# Altium footprint library 全库.PcbLib: 967 footprints (part 61 of 61)
Each footprint in its own frame and in the unit in brackets; x right, y up, seen from the top. Pads: shape width x height; smd on the part's side, far side on the other; paste and mask are expansions set on the pad; w line width, h text height; cw(c..) or ccw(c..) is an arc to the next point about the centre after c.
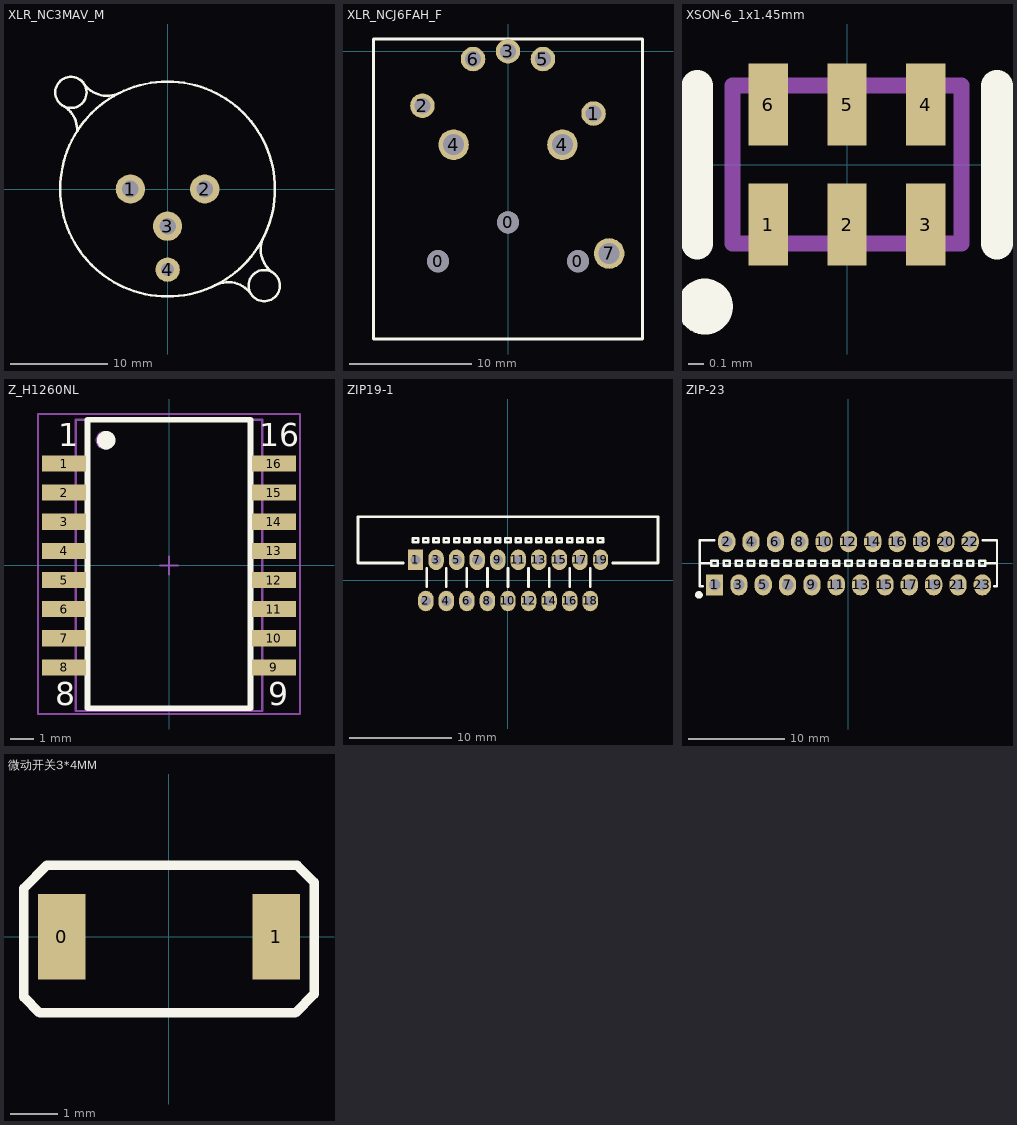
[diagram p60: the footprints below, top view; thin cyan lines are the x and y axes]

## XLR_NC3MAV_M [mm]
pads (4):
  round 3 hole 1.7: 1(-3.81,0) 2(3.81,0) 3(0,-3.81)
  round 2.5 hole 1.3: 4(0,-8.25)
Top Overlay:
  circle w0.254: c9.9,-9.9 r1.6
  circle w0.254: c-9.9,9.9 r1.6
  circle w0.254: c0,0 r11
  lines w0.254: -10.823,8.605 cw(c-12.162,6.021) -9.254,5.918 ; -8.661,10.922 ccw(c-6.19,12.459) -4.851,9.876 ; 4.846,-9.869 cw(c6.186,-12.453) 8.56,-10.77 ; 9.881,-4.826 ccw(c12.454,-6.185) 10.924,-8.661

## XLR_NCJ6FAH_F [mm]
pads (11):
  round 1.8 hole 1.8: 0(-5.715,-17.145) 0(0,-13.97) 0(5.715,-17.145)
  round 2 hole 1.3: 1(6.985,-5.08) 2(-6.985,-4.445) 3(0,0) 5(2.857,-0.635) 6(-2.857,-0.635)
  round 2.5 hole 1.7: 4(-4.445,-7.62) 4(4.445,-7.62) 7(8.255,-16.51)
Top Overlay:
  lines w0.254: -11,-23.495 11,-23.495 11,1.005 -11,1.005 -11,-23.495

## XSON-6_1x1.45mm [mm]
pads (6):
  rect 0.25x0.52 smd mask+0.051: 1(-0.5,-0.38) 2(0,-0.38) 3(0.5,-0.38) 4(0.5,0.38) 5(0,0.38) 6(-0.5,0.38)
Top Overlay:
  circle w0.254: c-0.9,-0.9 r0.05
  lines w0.2: -0.95,-0.5 -0.95,0.5 ; 0.95,-0.5 0.95,0.5
Mechanical 13:
  lines w0.1: -0.725,-0.5 0.725,-0.5 0.725,0.5 -0.725,0.5 -0.725,-0.5

## Z_H1260NL [mm]
pads (16):
  rect 1.91x0.7 smd: 1(-4.573,4.445) 2(-4.573,3.175) 3(-4.573,1.905) 4(-4.573,0.635) 5(-4.573,-0.635) 6(-4.573,-1.905) 7(-4.573,-3.175) 8(-4.573,-4.445) 9(4.573,-4.445) 10(4.573,-3.175) 11(4.573,-1.905) 12(4.573,-0.635) 13(4.573,0.635) 14(4.573,1.905) 15(4.573,3.175) 16(4.573,4.445)
Top Overlay:
  circle w0.4: c-2.741,5.461 r0.2
  lines w0.254: -3.557,-6.223 -3.557,4.445 -3.557,6.35 3.555,6.35 3.555,-6.223 -3.557,-6.223
  text "1" at -4.827,5.207 h1
  text "16" at 3.936,5.207 h1
  text "9" at 4.317,-6.096 h1
  text "8" at -4.954,-6.096 h1
Mechanical 13:
  circle w0.1: c-2.795,5.461 r0.359
  lines w0.1: -4.065,-6.35 4.063,-6.35 4.063,6.35 -4.065,6.35 -4.065,-6.35
Mechanical 15:
  lines w0.1: -0.382,0 0.38,0 ; -0.001,-0.381 -0.001,0.381 ; -5.716,-6.477 5.714,-6.477 5.714,6.604 -4.065,6.604 -5.716,6.604 -5.716,-6.477
3D body: height 0, standoff 0, extent -4.065,-6.35 4.063,6.35

## ZIP19-1 [mm]
pads (19):
  rect 1.5x2 hole 1: 1(-9,2)
  oval 1.5x2 hole 1: 2(-8,-2) 3(-7,2) 4(-6,-2) 5(-5,2) 6(-4,-2) 7(-3,2) 8(-2,-2) 9(-1,2) 10(0,-2) 11(1,2) 12(2,-2) 13(3,2) 14(4,-2) 15(5,2) 16(6,-2) 17(7,2) 18(8,-2) 19(9,2)
Top Overlay:
  lines w0.254: -10.2,1.7 -14.6,1.7 -14.6,6.2 14.6,6.2 14.6,1.7 10.2,1.7 ; -7.9,-0.6 -7.9,1.2 ; -6,-0.6 -6,1.2 ; -4,-0.6 -4,1.2 ; -2,-0.6 -2,1.2 ; 0,-0.6 0,1.2 ; 2,-0.6 2,1.2 ; 4,-0.6 4,1.2 ; 6,-0.6 6,1.2 ; 8,-0.6 8,1.2 ; -9.25,3.7 -9.25,4.1 -8.75,4.1 -8.75,3.7 -9.25,3.7 ; -8.25,3.7 -7.75,3.7 -7.75,4.1 -8.25,4.1 -8.25,3.7 ; -7.25,3.7 -7.25,4.1 -6.75,4.1 -6.75,3.7 -7.25,3.7 ; -6.25,3.7 -5.75,3.7 -5.75,4.1 -6.25,4.1 -6.25,3.7 ; -5.25,3.7 -5.25,4.1 -4.75,4.1 -4.75,3.7 -5.25,3.7 ; -4.25,3.7 -3.75,3.7 -3.75,4.1 -4.25,4.1 -4.25,3.7 ; -3.25,3.7 -3.25,4.1 -2.75,4.1 -2.75,3.7 -3.25,3.7 ; -2.25,3.7 -1.75,3.7 -1.75,4.1 -2.25,4.1 -2.25,3.7 ; -1.25,3.7 -0.75,3.7 -0.75,4.1 -1.25,4.1 -1.25,3.7 ; -0.25,3.7 -0.25,4.1 0.25,4.1 0.25,3.7 -0.25,3.7 ; 0.75,3.7 0.75,4.1 1.25,4.1 1.25,3.7 0.75,3.7 ; 1.75,3.7 2.25,3.7 2.25,4.1 1.75,4.1 1.75,3.7 ; 2.75,3.7 2.75,4.1 3.25,4.1 3.25,3.7 2.75,3.7 ; 3.75,3.7 4.25,3.7 4.25,4.1 3.75,4.1 3.75,3.7 ; 4.75,3.7 4.75,4.1 5.25,4.1 5.25,3.7 4.75,3.7 ; 5.75,3.7 6.25,3.7 6.25,4.1 5.75,4.1 5.75,3.7 ; 6.75,3.7 6.75,4.1 7.25,4.1 7.25,3.7 6.75,3.7 ; 7.75,3.7 8.25,3.7 8.25,4.1 7.75,4.1 7.75,3.7 ; 8.75,3.7 8.75,4.1 9.25,4.1 9.25,3.7 8.75,3.7

## ZIP-23 [mm]
pads (23):
  rect 1.8x2.2 hole 1.2: 1(-13.97,-2.25)
  oval 1.8x2.2 hole 1.2: 2(-12.7,2.25) 3(-11.43,-2.25) 4(-10.16,2.25) 5(-8.89,-2.25) 6(-7.62,2.25) 7(-6.35,-2.25) 8(-5.08,2.25) 9(-3.81,-2.25) 10(-2.54,2.25) 11(-1.27,-2.25) 12(0,2.25) 13(1.27,-2.25) 14(2.54,2.25) 15(3.81,-2.25) 16(5.08,2.25) 17(6.35,-2.25) 18(7.62,2.25) 19(8.89,-2.25) 20(10.16,2.25) 21(11.43,-2.25) 22(12.7,2.25) 23(13.97,-2.25)
Top Overlay:
  circle w0.4: c-15.6,-3.3 r0.2
  lines w0.254: -15.5,0 -14.5,0 ; -15.2,-2.4 -15.5,-2.4 -15.5,2.4 -14,2.4 ; 14,2.4 15.5,2.4 15.5,-2.4 15.2,-2.4 ; 14.5,0 15.5,0 ; -14.295,-0.275 -14.295,0.275 -13.645,0.275 -13.645,-0.275 -14.295,-0.275 ; -13.025,-0.275 -12.375,-0.275 -12.375,0.275 -13.025,0.275 -13.025,-0.275 ; -11.755,-0.275 -11.755,0.275 -11.105,0.275 -11.105,-0.275 -11.755,-0.275 ; -10.485,-0.275 -9.835,-0.275 -9.835,0.275 -10.485,0.275 -10.485,-0.275 ; -9.215,-0.275 -9.215,0.275 -8.565,0.275 -8.565,-0.275 -9.215,-0.275 ; -7.945,-0.275 -7.295,-0.275 -7.295,0.275 -7.945,0.275 -7.945,-0.275 ; -6.675,-0.275 -6.675,0.275 -6.025,0.275 -6.025,-0.275 -6.675,-0.275 ; -5.405,-0.275 -4.755,-0.275 -4.755,0.275 -5.405,0.275 -5.405,-0.275 ; -4.135,-0.275 -4.135,0.275 -3.485,0.275 -3.485,-0.275 -4.135,-0.275 ; -2.865,-0.275 -2.215,-0.275 -2.215,0.275 -2.865,0.275 -2.865,-0.275 ; -1.595,-0.275 -0.945,-0.275 -0.945,0.275 -1.595,0.275 -1.595,-0.275 ; -0.325,-0.275 -0.325,0.275 0.325,0.275 0.325,-0.275 -0.325,-0.275 ; 0.945,-0.275 0.945,0.275 1.595,0.275 1.595,-0.275 0.945,-0.275 ; 2.215,-0.275 2.215,0.275 2.865,0.275 2.865,-0.275 2.215,-0.275 ; 3.485,-0.275 4.135,-0.275 4.135,0.275 3.485,0.275 3.485,-0.275 ; 4.755,-0.275 4.755,0.275 5.405,0.275 5.405,-0.275 4.755,-0.275 ; 6.025,-0.275 6.675,-0.275 6.675,0.275 6.025,0.275 6.025,-0.275 ; 7.295,-0.275 7.295,0.275 7.945,0.275 7.945,-0.275 7.295,-0.275 ; 8.565,-0.275 9.215,-0.275 9.215,0.275 8.565,0.275 8.565,-0.275 ; 9.835,-0.275 9.835,0.275 10.485,0.275 10.485,-0.275 9.835,-0.275 ; 11.105,-0.275 11.755,-0.275 11.755,0.275 11.105,0.275 11.105,-0.275 ; 12.375,-0.275 12.375,0.275 13.025,0.275 13.025,-0.275 12.375,-0.275 ; 13.645,-0.275 13.645,0.275 14.295,0.275 14.295,-0.275 13.645,-0.275

## 微动开关3*4MM [mm]
pads (2):
  rect 1x1.8 smd: 0(-2.25,0) 1(2.25,0)
Top Overlay:
  lines w0.2: -3.048,-1.27 -2.718,-1.6 0.137,-1.6 2.654,-1.6 3.048,-1.206 3.048,1.143 2.691,1.5 -2.564,1.5 -3.048,1.016 -3.048,-0.313 -3.048,-1.27